# Altium footprint library LDCN Components.PcbLib: 426 footprints (part 11 of 27)
Each footprint in its own frame and in the unit in brackets; x right, y up, seen from the top. Pads: shape width x height; smd on the part's side, far side on the other; paste and mask are expansions set on the pad; w line width, h text height; cw(c..) or ccw(c..) is an arc to the next point about the centre after c.
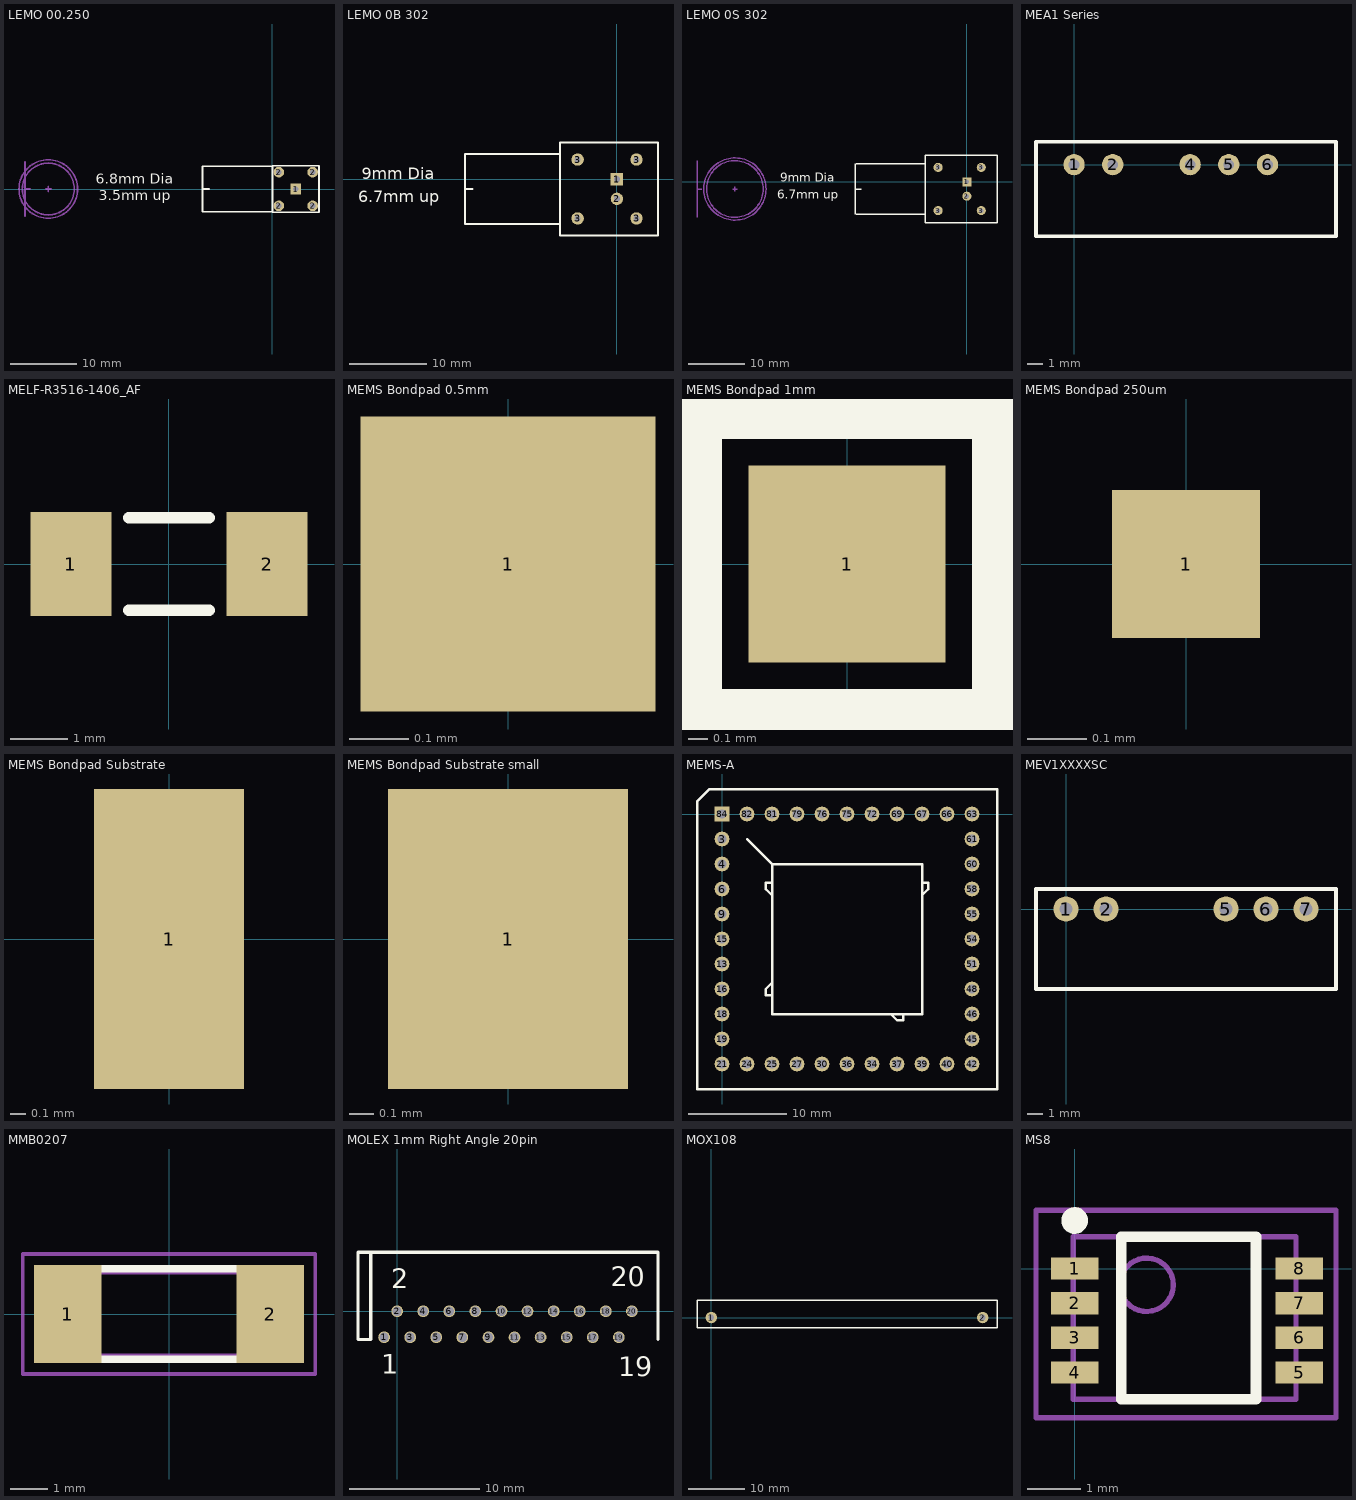
[diagram p10: the footprints below, top view; thin cyan lines are the x and y axes]

## LEMO 00.250 [mm] "EPL.00.250.NTN"
height 7
pads (5):
  rect 1.6x1.6 hole 0.8: 1(3.5,0)
  round 1.6 hole 0.8: 2(0.96,-2.54) 2(0.96,2.54) 2(6.04,-2.54) 2(6.04,2.54)
Top Overlay:
  lines w0.254: -9.5,0 -10.5,0 ; 0,-3.4 -10.5,-3.4 -10.5,0 ; 0,3.4 -10.5,3.4 -10.5,0 ; 0,-3.5 7,-3.5 7,0 7,3.5 0,3.5 0,0 0,-3.5
  text "6.8mm Dia" at -26.54,0.8 h1.52
  text "3.5mm up" at -26.14,-1.7 h1.52
Mechanical 21:
  circle w0.254: c-33.7,0 r3.9
Mechanical 22:
  lines w0.254: -37.2,-4.1 -37.2,4.1 ; -37.2,0 -36.4,0 ; -34.1,0 -33.3,0 ; -33.7,-0.4 -33.7,0.4
Mechanical 25:
  circle w0.254: c-33.7,0 r4.4

## LEMO 0B 302 [mm] "EPG.0B.302.HLN"
height 12.7
pads (6):
  rect 1.6x1.6 hole 0.8: 1(0,0)
  round 1.6 hole 0.8: 2(0,-2.54) 3(-5.08,-5.08) 3(-5.08,2.54) 3(2.54,-5.08) 3(2.54,2.54)
Top Overlay:
  lines w0.254: -19.68,-5.77 -19.68,-1.27 ; -19.68,3.23 -19.68,-1.27 ; -19.58,-5.77 -7.38,-5.77 ; -19.58,3.23 -7.38,3.23 ; -18.68,-1.27 -19.68,-1.27 ; -7.38,-7.27 -7.38,-1.27 -7.38,4.73 5.32,4.73 5.32,-1.27 5.32,-7.27 -7.38,-7.27
  text "6.7mm up" at -33.5,-3 h1.52
  text "9mm Dia" at -33,0 h1.52

## LEMO 0S 302 [mm] "EPL.0S.302.HLN"
height 12.7
pads (6):
  rect 1.6x1.6 hole 0.8: 1(0,0)
  round 1.6 hole 0.8: 2(0,-2.54) 3(-5.08,-5.08) 3(-5.08,2.54) 3(2.54,-5.08) 3(2.54,2.54)
Top Overlay:
  lines w0.254: -19.68,-5.77 -19.68,-1.27 ; -19.68,3.23 -19.68,-1.27 ; -19.58,-5.77 -7.38,-5.77 ; -19.58,3.23 -7.38,3.23 ; -18.68,-1.27 -19.68,-1.27 ; -7.38,-7.27 5.32,-7.27 5.32,-1.27 5.32,4.73 -7.38,4.73 -7.38,-1.27 -7.38,-7.27
  text "9mm Dia" at -33,0 h1.52
  text "6.7mm up" at -33.5,-3 h1.52
Mechanical 21:
  circle w0.254: c-40.98,-1.27 r5
Mechanical 22:
  lines w0.254: -47.68,-6.27 -47.68,3.73 ; -47.68,-1.27 -46.88,-1.27 ; -41.38,-1.27 -40.58,-1.27 ; -40.98,-1.67 -40.98,-0.87
Mechanical 25:
  circle w0.254: c-40.98,-1.27 r5.5

## MEA1 Series [mm] "Murata MEA DC-DC"
height 10
pads (5):
  round 1.4 hole 0.7: 1(0,0) 2(2.54,0) 4(7.62,0) 5(10.16,0) 6(12.7,0)
Top Overlay:
  lines w0.254: -2.5,-4.7 -2.5,1.5 17.2,1.5 17.2,-4.7 -2.5,-4.7

## MELF-R3516-1406_AF [mm] "Metal Electrode Face (MELF) Resistor; Body 3.5 x 1.6 mm (LxDia)"
height 1.65
pads (2):
  rect 1.4x1.8 smd: 1(-1.7,0) 2(1.7,0)
Top Overlay:
  lines w0.2: -0.7,-0.8 0.7,-0.8 ; -0.7,0.8 0.7,0.8

## MEMS Bondpad 0.5mm [mm]
pads (1):
  rect 0.5x0.5 smd: 1(0,0)

## MEMS Bondpad 1mm [mm]
pads (1):
  rect 1x1 smd: 1(0,0)
Top Overlay:
  lines w0.254: -0.762,-0.762 0.762,-0.762 0.762,0.762 -0.762,0.762 -0.762,0.508 -0.762,-0.762

## MEMS Bondpad 250um [mm]
pads (1):
  rect 0.25x0.25 smd: 1(0,0)

## MEMS Bondpad Substrate [mm]
pads (1):
  rect 1x2 smd: 1(0,0)

## MEMS Bondpad Substrate small [mm]
pads (1):
  rect 1x1.25 smd: 1(0,0)

## MEMS-A [mm] "SIP Holder"
pads (40):
  round 1.5 hole 0.9: 3(0,-2.54) 4(0,-5.08) 6(0,-7.62) 9(0,-10.16) 13(0,-15.24) 15(0,-12.7) 16(0,-17.78) 18(0,-20.32) 19(0,-22.86) 21(0,-25.4) 24(2.54,-25.4) 25(5.08,-25.4) 27(7.62,-25.4) 30(10.16,-25.4) 34(15.24,-25.4) 36(12.7,-25.4) 37(17.78,-25.4) 39(20.32,-25.4) 40(22.86,-25.4) 42(25.4,-25.4) 45(25.4,-22.86) 46(25.4,-20.32) 48(25.4,-17.78) 51(25.4,-15.24) 54(25.4,-12.7) 55(25.4,-10.16) 58(25.4,-7.62) 60(25.4,-5.08) 61(25.4,-2.54) 63(25.4,0) 66(22.86,0) 67(20.32,0) 69(17.78,0) 72(15.24,0) 75(12.7,0) 76(10.16,0) 79(7.62,0) 81(5.08,0) 82(2.54,0)
  rect 1.5x1.5 hole 0.9: 84(0,0)
Top Overlay:
  lines w0.254: 2.54,-2.54 5.08,-5.08 ; 5.08,-18.415 4.445,-18.415 4.445,-17.78 5.08,-17.145 ; 5.08,-8.255 4.445,-7.62 4.445,-6.985 5.08,-6.985 ; 17.145,-20.32 17.78,-20.955 18.415,-20.955 18.415,-20.32 ; 20.32,-8.255 20.955,-7.62 20.955,-6.985 20.32,-6.985 ; 5.08,-5.08 5.08,-20.32 20.32,-20.32 20.32,-5.08 5.08,-5.08 ; -2.54,-27.94 27.94,-27.94 27.94,2.54 -1.27,2.54 -2.54,1.27 -2.54,-27.94

## MEV1XXXXSC [mm]
height 10
pads (5):
  round 1.6 hole 0.8: 1(0,0) 2(2.54,0) 5(10.16,0) 6(12.7,0) 7(15.24,0)
Top Overlay:
  lines w0.254: -1.905,-5.08 17.145,-5.08 17.145,1.27 -1.905,1.27 -1.905,-5.08

## MMB0207 [mm]
height 3
pads (2):
  rect 1.8x2.6 smd: 1(-2.7,0) 2(2.7,0)
Top Overlay:
  lines w0.2: -1.8,-1.2 1.8,-1.2 ; -1.8,1.2 1.8,1.2
Mechanical 13:
  lines w0.102: -2.9,-1.1 2.9,-1.1 2.9,1.1 -2.9,1.1 -2.9,-1.1
Mechanical 15:
  lines w0.102: -3.9,-1.6 -3.9,1.6 3.9,1.6 3.9,-1.6 -3.9,-1.6

## MOLEX 1mm Right Angle 20pin [mm]
height 3.6
pads (20):
  round 0.9 hole 0.7: 1(-1,-2) 2(0,0) 3(1,-2) 4(2,0) 5(3,-2) 6(4,0) 7(5,-2) 8(6,0) 9(7,-2) 10(8,0) 11(9,-2) 12(10,0) 13(11,-2) 14(12,0) 15(13,-2) 16(14,0) 17(15,-2) 18(16,0) 19(17,-2) 20(18,0)
Top Overlay:
  lines w0.254: -2.04,-2.17 -3,-2.17 -3,4.53 20,4.53 20,-2.17 ; -2.025,-2.155 -2.025,4.54
  text "20" at 16.365,1.895 h1.52
  text "2" at -0.435,1.755 h1.52
  text "19" at 16.965,-4.97 h1.52
  text "1" at -1.21,-4.815 h1.52
3D body "52807-2010.stp": height 3.6, standoff -3.2, extent -2.975,-2.195 20.025,4.505

## MOX108 [mil] "OHMITE SLIM-MOX108 Package"
height 393.7
pads (2):
  round 80 hole 40: 1(0,0) 2(1900,0)
Top Overlay:
  lines w10: 20,-70 920,-70 ; 30,120 930,120 ; 125,-70 -100,-70 -100,120 125,120 ; 775,-70 2000,-70 2000,120 775,120

## MS8 [mm] "SOIC, 8-Leads, Body 4.9x3.9mm, Pitch 1.27mm, IPC Low Density"
height 1.1
pads (8):
  rect 0.889x0.42 smd: 1(0,0) 2(0,-0.65) 3(0,-1.3) 4(0,-1.95) 5(4.211,-1.95) 6(4.211,-1.3) 7(4.211,-0.65) 8(4.211,0)
Top Overlay:
  circle w0.25: c0,0.9 r0.125
  lines w0.2: 0.875,-2.45 3.4,-2.45 3.4,0.595 0.875,0.595 0.875,-2.45
Mechanical 13:
  circle w0.1: c1.35,-0.305 r0.5
  lines w0.1: -0.025,-2.45 4.15,-2.45 4.15,0.595 -0.025,0.595 -0.025,-2.45
Mechanical 15:
  lines w0.1: -0.725,-2.8 -0.725,1.095 4.9,1.095 4.9,-2.8 -0.725,-2.8
3D body: height 1.75, standoff 0, extent -0.025,-2.45 4.15,0.595